# Altium schematic symbol library GyokuRe.SchLib: 1131 symbols (part 3 of 8)
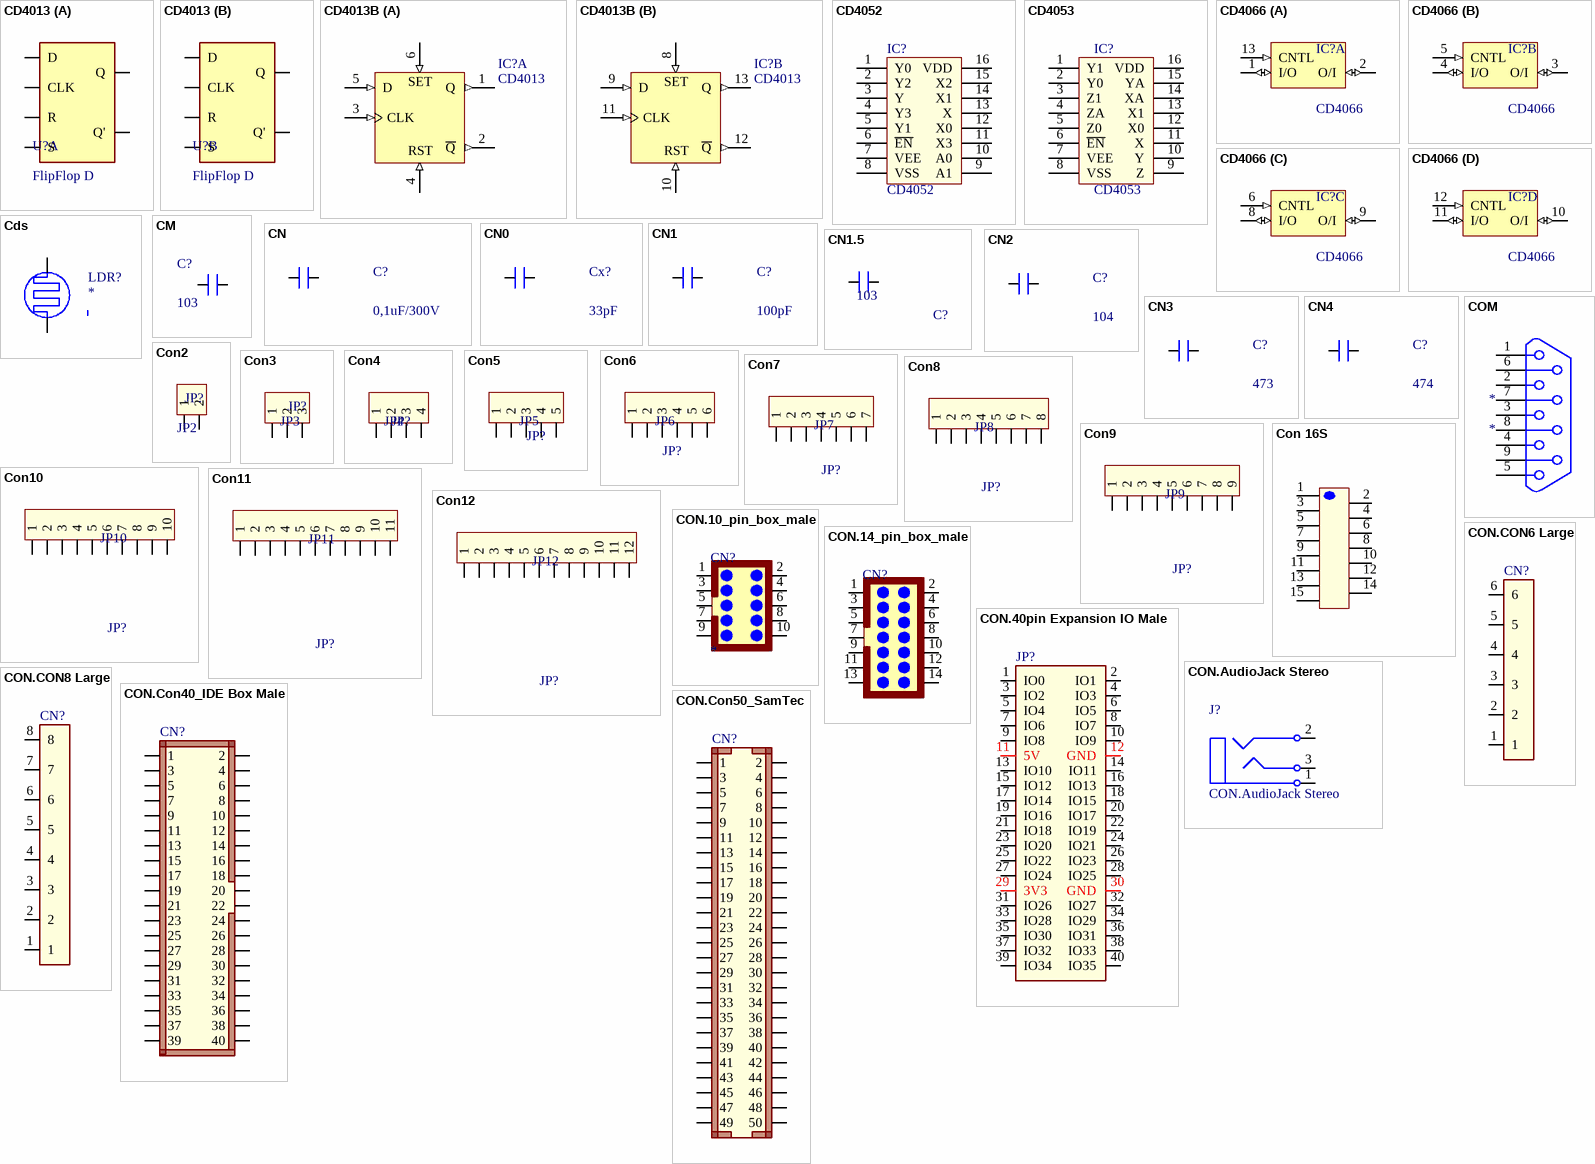
[diagram p51: symbols CD4013 to CON.Con50_SamTec]

## Con12
designator JP?, comment JP12
Connector 12; Value: Connector 12
footprint CON12
pins: 1, 2, 3, 4, 5, 6, 7, 8, 9, 10, 11, 12

## Con 16S
designator J?, comment Con16S
Connector 16S; Value: Con 16S
footprint CON16S (Jam 16S)
pins: 1, 2 3, 3 5, 4 7, 5 9, 6 11, 7 13, 8 15, 9 16, 10 17, 11 18, 12 19, 13 20, 14 21, 15 22

## CON.10_pin_box_male
designator CN?
10 pin box male; Publisher: Hoang Nguyen; ComponentLink1Description: Digikey Part link; ComponentLink2Description: Open DataSheet; ComponentLink2URL: H:\LIBRARY\LIBRARY.Datasheet\
3D model 10_pin_box_male (PCB3D Model)
3D model TSS-105-01-X-D (PCB3D Model)
3D model TSS-105-04-X-D-RA (PCB3D Model)
footprint 10 pin box male
footprint 10 pin box male Vertical (Connector; IDC, Low Profile Male Header, Thru-Hole; 10 Position; Right Angle; Pitch 2.54 mm; Body 20.32 x 8.9 x 9.2 mm (LxWxH))
pins: 1, 2, 3, 4, 5, 6, 7, 8, 9, 10

## CON.14_pin_box_male
designator CN?  (value not drawn)
14 pins box male; Publisher: Hoang Nguyen; ComponentLink1Description: Digikey Part link; ComponentLink2Description: Open DataSheet; ComponentLink2URL: H:\LIBRARY\LIBRARY.Datasheet\
3D model TSS-107-01-X-D (PCB3D Model)
footprint 14 pin box male
footprint 14 pin box male Vertical (Connector; IDC, Low Profile Male Header, Thru-Hole; 14 Position; Right Angle; Pitch 2.54 mm; Body 25.40 x 8.9 x 9.2 mm (LxWxH))
pins: 1, 2, 3, 4, 5, 6, 7, 8, 9, 10, 11, 12, 13, 14

## CON.40pin Expansion IO Male
designator JP?  (value not drawn)
40pin Expansion IO Male; Publisher: Hoang Nguyen; ComponentLink1Description: Digikey Part link; ComponentLink2Description: Open DataSheet; ComponentLink2URL: H:\LIBRARY\LIBRARY.Datasheet\
footprint HDR2X20
footprint HDR2X20H
pins: 1 IO0, 2 IO1, 3 IO2, 4 IO3, 5 IO4, 6 IO5, 7 IO6, 8 IO7, 9 IO8, 10 IO9, 11 5V, 12 GND, 13 IO10, 14 IO11, 15 IO12, 16 IO13, 17 IO14, 18 IO15, 19 IO16, 20 IO17, 21 IO18, 22 IO19, 23 IO20, 24 IO21, 25 IO22, 26 IO23, 27 IO24, 28 IO25, 29 3V3, 30 GND, 31 IO26, 32 IO27, 33 IO28, 34 IO29, 35 IO30, 36 IO31, 37 IO32, 38 IO33, 39 IO34, 40 IO35

## CON.AudioJack Stereo
designator J?
AUDIO JACK 3.5MM STEREO SMD; Vendor: Digi-Key; Vendor P/N: CP-3523SJTR-ND; Published: 5-Jan-2004; DatasheetDocument: 07-Mar-2000; Publisher: Altium Limited; Mounting Type: Surface Mount, Right Angle; ComponentLink1Description: Digikey Part link; ComponentLink1URL: http://search.digikey.com/scripts/DkSearch/dksus.dll?Detail&name=CP-3523SJTR-ND; ComponentLink2Description: Open DataSheet; ComponentLink2URL: H:\LIBRARY\LIBRARY.Datasheet\
pcadlib ST-3150-5N (Stereo Jack, 3.5mm, 5 Position)
footprint SJ-3523-SMT (CONN AUDIO JACK 3.5MM STEREO SMD)
footprint Audio jack 3.5mm
pins: 1, 2, 3

## CON.CON6 Large
designator CN?  (value not drawn)
CON 6 LARGE; Publisher: Hoang Nguyen; ComponentLink1Description: Digikey Part link; ComponentLink2Description: Open DataSheet; ComponentLink2URL: H:\LIBRARY\LIBRARY.Datasheet\
footprint 6CHANNEWS
pins: 1, 2, 3, 4, 5, 6

## CON.CON8 Large
designator CN?  (value not drawn)
8 pins large Connector; Publisher: Hoang Nguyen; ComponentLink1Description: Digikey Part link; ComponentLink2Description: Open DataSheet; ComponentLink2URL: H:\LIBRARY\LIBRARY.Datasheet\
footprint 8CHANNEWS
pins: 1, 2, 3, 4, 5, 6, 7, 8

## CON.Con40_IDE Box Male
designator CN?  (value not drawn)
40pins IDE Box Male; Publisher: Hoang Nguyen; ComponentLink1Description: Digikey Part link; ComponentLink2Description: Open DataSheet; ComponentLink2URL: H:\LIBRARY\LIBRARY.Datasheet\
footprint HDR2X20H
footprint HDR2X20
pins: 1, 2, 3, 4, 5, 6, 7, 8, 9, 10, 11, 12, 13, 14, 15, 16, 17, 18, 19, 20, 21, 22, 23, 24, 25, 26, 27, 28, 29, 30, 31, 32, 33, 34, 35, 36, 37, 38, 39, 40

## CON.Con50_SamTec
designator CN?  (value not drawn)
50 pins SamTec Connector; Publisher: Hoang Nguyen; ComponentLink1Description: Digikey Part link; ComponentLink2Description: Open DataSheet; ComponentLink2URL: H:\LIBRARY\LIBRARY.Datasheet\
footprint Con50_SamTec
pins: 1, 2, 3, 4, 5, 6, 7, 8, 9, 10, 11, 12, 13, 14, 15, 16, 17, 18, 19, 20, 21, 22, 23, 24, 25, 26, 27, 28, 29, 30, 31, 32, 33, 34, 35, 36, 37, 38, 39, 40, 41, 42, 43, 44, 45, 46, 47, 48, 49, 50

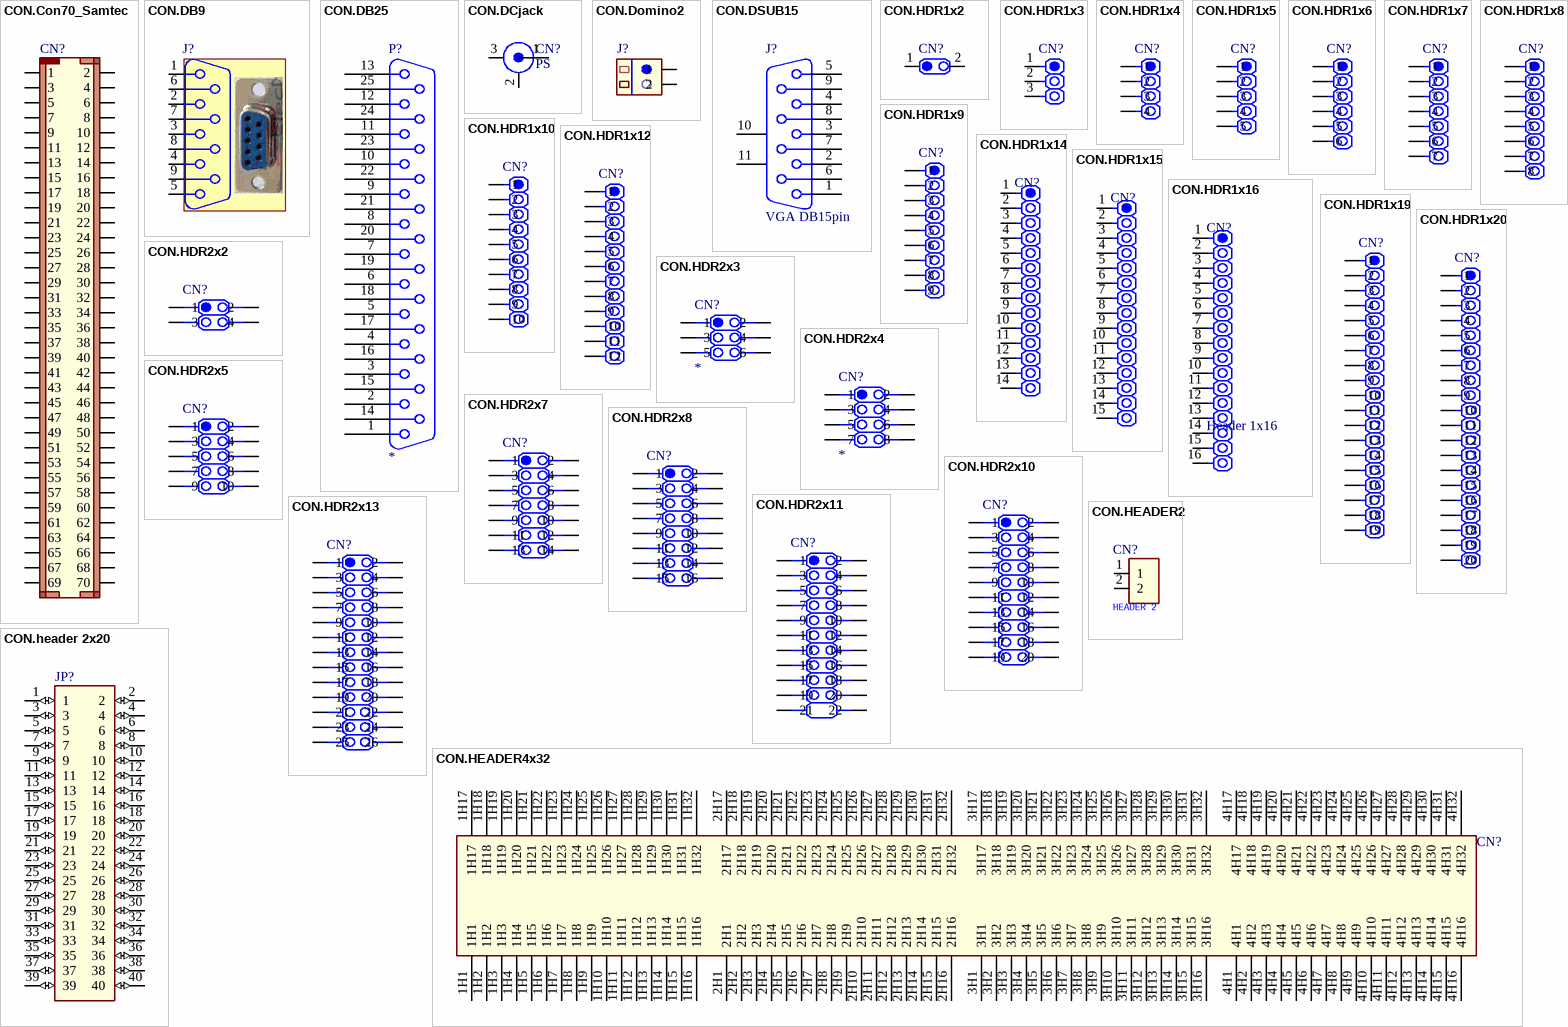
[diagram p13: symbols CON.Con70_Samtec to CON.header 2x20]

## CON.Con70_Samtec
designator CN?  (value not drawn)
70 Pins Samtec Connector; Publisher: Hoang Nguyen; ComponentLink1Description: Digikey Part link; ComponentLink2Description: Open DataSheet; ComponentLink2URL: H:\LIBRARY\LIBRARY.Datasheet\
footprint Con70_Samtec
pins: 1, 2, 3, 4, 5, 6, 7, 8, 9, 10, 11, 12, 13, 14, 15, 16, 17, 18, 19, 20, 21, 22, 23, 24, 25, 26, 27, 28, 29, 30, 31, 32, 33, 34, 35, 36, 37, 38, 39, 40, 41, 42, 43, 44, 45, 46, 47, 48, 49, 50, 51, 52, 53, 54, 55, 56, 57, 58, 59, 60, 61, 62, 63, 64, 65, 66, 67, 68, 69, 70

## CON.DB9
designator J?  (value not drawn)
CONN DB9 FEMALE .318" R/A NICKEL; Manufacturer: Norcomp Inc; Manufacturer P/N: 182-009-213R161; Vendor: DegiKey; Vendor P/N: 182-709FE-ND; Publisher: Hoang Nguyen; ComponentLink1Description: Digikey Part link; ComponentLink2Description: Open DataSheet; ComponentLink2URL: H:\LIBRARY\LIBRARY.Datasheet\; Price: 3.000VND
footprint DSUB1.9_FEMALE (7906 Series DSUB Right Angle Socket; Body Width, 30.81mm, 9 Positions)
footprint DSUB1.9_MALE (7906 Series DSUB Right Angle Plug; Body Width, 30.81mm, 9 Positions)
footprint DSUB1.9_FEMALE_N (7906 Series DSUB Right Angle Socket; Body Width, 30.81mm, 9 Positions)
footprint DSUB1.9_FEMALE_M (7906 Series DSUB Right Angle Socket; Body Width, 30.81mm, 9 Positions)
footprint DSUB1.9_modified (7906 Series DSUB Right Angle Socket; Body Width, 30.81mm, 9 Positions)
pins: 1, 2, 3, 4, 5, 6, 7, 8, 9

## CON.DB25
designator P?
Parallel Port; ComponentLink1Description: Digikey Part link; ComponentLink2Description: Open DataSheet; ComponentLink2URL: H:\LIBRARY\LIBRARY.Datasheet\
pins: 1, 2, 3, 4, 5, 6, 7, 8, 9, 10, 11, 12, 13, 14, 15, 16, 17, 18, 19, 20, 21, 22, 23, 24, 25

## CON.DCjack
designator CN?, comment PS
DC Power Jack, 2.5mm, KLD Series, PCB Mount; Vendor: Nhat Tao; ComponentLink1Description: Digikey Part link; ComponentLink2Description: Open DataSheet; ComponentLink2URL: H:\LIBRARY\LIBRARY.Datasheet\; Price: 1.500VND
footprint DC TERMINAL (DC Terminal; Solder Pad 30mil)
footprint JACK DC
pins: 1 CENTER (power), 2 SHIELD (power), 3 SHIELD

## CON.Domino2
designator J?  (value not drawn)
2 pins Domino Header; Publisher: Hoang Nguyen; ComponentLink1Description: Digikey Part link; ComponentLink2Description: Open DataSheet; ComponentLink2URL: H:\LIBRARY\LIBRARY.Datasheet\; Price: 2000VND
footprint TS2.54x2 (Screw Terminal Strip, 2 Way, 2.54 mm Pitch)
footprint Domino 2
footprint Domino 2 - Thao roi
footprint Domino 2N
footprint Domino 2M
pins: 1, 2

## CON.DSUB15
designator J?, comment VGA DB15pin
Published: 5-Jan-2004; Publisher: Altium Limited; ComponentLink1Description: Digikey Part link; ComponentLink2Description: Open DataSheet; ComponentLink2URL: H:\LIBRARY\LIBRARY.Datasheet\; Price: 3500VND
footprint DSUB1.385-2H9 (7906 Series DSUB Right Angle Socket; Body Width, 30.81mm, 9 Positions)
pcadlib DSUB1.385-2H9 (7906 Series DSUB Right Angle Socket; Body Width, 30.81mm, 9 Positions)
pins: 1, 2, 3, 4, 5, 6, 7, 8, 9, 10 MH1, 11 MH2

## CON.HDR1x2
designator CN?, comment IO  (value not drawn)
Header 1x2; Publisher: Hoang Nguyen; ComponentLink1Description: Digikey Part link; ComponentLink2Description: Open DataSheet; ComponentLink2URL: H:\LIBRARY\LIBRARY.Datasheet\
footprint CON.HDR1X2
3D model HDR2x1 (PCB3D Model)
footprint CON.HDR1X2H
3D model TSW-102-06-X-S (PCB3D Model)
3D model TSW-102-07-X-S (PCB3D Model)
pins: 1, 2

## CON.HDR1x3
designator CN?, comment IO  (value not drawn)
Header 1x3; Publisher: Hoang Nguyen; ComponentLink1Description: Digikey Part link; ComponentLink2Description: Open DataSheet; ComponentLink2URL: H:\LIBRARY\LIBRARY.Datasheet\
footprint CON.HDR1X3
footprint CON.HDR1X3H
footprint CON1X3N (Footprint not found)
pins: 1, 2, 3

## CON.HDR1x4
designator CN?, comment IO  (value not drawn)
Header 1x4; Publisher: Hoang Nguyen; ComponentLink1Description: Digikey Part link; ComponentLink2Description: Open DataSheet; ComponentLink2URL: H:\LIBRARY\LIBRARY.Datasheet\
footprint CON.HDR1X4
footprint CON.HDR1X4H
footprint CON1X4N
pins: 1, 2, 3, 4

## CON.HDR1x5
designator CN?, comment IO  (value not drawn)
Header 1x5; Publisher: Hoang Nguyen; ComponentLink1Description: Digikey Part link; ComponentLink2Description: Open DataSheet; ComponentLink2URL: H:\LIBRARY\LIBRARY.Datasheet\
footprint CON.HDR1X5
footprint CON.HDR1X5H
footprint CON1X5N
pins: 1, 2, 3, 4, 5

## CON.HDR1x6
designator CN?, comment IO  (value not drawn)
Header 1x6; Publisher: Hoang Nguyen; ComponentLink1Description: Digikey Part link; ComponentLink2Description: Open DataSheet; ComponentLink2URL: H:\LIBRARY\LIBRARY.Datasheet\
footprint CON.HDR1X6
footprint CON.HDR1X6H
footprint CON1X6N
pins: 1, 2, 3, 4, 5, 6

## CON.HDR1x7
designator CN?  (value not drawn)
Header 1x7; Publisher: Hoang Nguyen; ComponentLink1Description: Digikey Part link; ComponentLink2Description: Open DataSheet; ComponentLink2URL: H:\LIBRARY\LIBRARY.Datasheet\
footprint CON.HDR1X7
footprint CON.HDR1X7H
pins: 1, 2, 3, 4, 5, 6, 7

## CON.HDR1x8
designator CN?  (value not drawn)
Header 1x8; Publisher: Hoang Nguyen; ComponentLink1Description: Digikey Part link; ComponentLink2Description: Open DataSheet; ComponentLink2URL: H:\LIBRARY\LIBRARY.Datasheet\
footprint HDR1X8
footprint HDR1X8H
footprint CON1X8N
pins: 1, 2, 3, 4, 5, 6, 7, 8

## CON.HDR1x9
designator CN?  (value not drawn)
Header 1x9; Publisher: Hoang Nguyen; ComponentLink1Description: Digikey Part link; ComponentLink2Description: Open DataSheet; ComponentLink2URL: H:\LIBRARY\LIBRARY.Datasheet\
footprint HDR1X9
footprint HDR1X9H
pins: 1, 2, 3, 4, 5, 6, 7, 8, 9

## CON.HDR1x10
designator CN?  (value not drawn)
Header 1x10; Publisher: Hoang Nguyen; ComponentLink1Description: Digikey Part link; ComponentLink2Description: Open DataSheet; ComponentLink2URL: H:\LIBRARY\LIBRARY.Datasheet\
footprint HDR1X10
footprint HDR1X10H
footprint CON1X10N
pins: 1, 2, 3, 4, 5, 6, 7, 8, 9, 10

## CON.HDR1x12
designator CN?  (value not drawn)
Header 1x12; Publisher: Hoang Nguyen; ComponentLink1Description: Digikey Part link; ComponentLink2Description: Open DataSheet; ComponentLink2URL: H:\LIBRARY\LIBRARY.Datasheet\
footprint HDR1X12
footprint HDR1X12H
pins: 1, 2, 3, 4, 5, 6, 7, 8, 9, 10, 11, 12

## CON.HDR1x14
designator CN?  (value not drawn)
Header 1x14; Publisher: Hoang Nguyen; ComponentLink1Description: Digikey Part link; ComponentLink2Description: Open DataSheet; ComponentLink2URL: H:\LIBRARY\LIBRARY.Datasheet\
footprint HDR1X14
footprint HDR1X14H
footprint CON1X14N
pins: 1, 2, 3, 4, 5, 6, 7, 8, 9, 10, 11, 12, 13, 14

## CON.HDR1x15
designator CN?  (value not drawn)
Header 1x15; Publisher: Hoang Nguyen; ComponentLink1Description: Digikey Part link; ComponentLink2Description: Open DataSheet; ComponentLink2URL: H:\LIBRARY\LIBRARY.Datasheet\
footprint HDR1X15
footprint HDR1X15H
pins: 1, 2, 3, 4, 5, 6, 7, 8, 9, 10, 11, 12, 13, 14, 15

## CON.HDR1x16
designator CN?, comment Header 1x16
Publisher: Hoang Nguyen; Value: Header1x16; ComponentLink1Description: Digikey Part link; ComponentLink2Description: Open DataSheet; ComponentLink2URL: H:\LIBRARY\LIBRARY.Datasheet\
footprint HDR1X16
footprint HDR1X16H
pins: 1, 2, 3, 4, 5, 6, 7, 8, 9, 10, 11, 12, 13, 14, 15, 16

## CON.HDR1x19
designator CN?  (value not drawn)
Header 1x19; Publisher: Hoang Nguyen; ComponentLink1Description: Digikey Part link; ComponentLink2Description: Open DataSheet; ComponentLink2URL: H:\LIBRARY\LIBRARY.Datasheet\
footprint HDR1X19
footprint HDR1X19H
pins: 1, 2, 3, 4, 5, 6, 7, 8, 9, 10, 11, 12, 13, 14, 15, 16, 17, 18, 19

## CON.HDR1x20
designator CN?  (value not drawn)
Header 1x20; Publisher: Hoang Nguyen; ComponentLink1Description: Digikey Part link; ComponentLink2Description: Open DataSheet; ComponentLink2URL: H:\LIBRARY\LIBRARY.Datasheet\
footprint HDR1X20
footprint HDR1X20H
pins: 1, 2, 3, 4, 5, 6, 7, 8, 9, 10, 11, 12, 13, 14, 15, 16, 17, 18, 19, 20

## CON.HDR2x2
designator CN?  (value not drawn)
Header 2x2; Publisher: Hoang Nguyen; ComponentLink1Description: Digikey Part link; ComponentLink2Description: Open DataSheet; ComponentLink2URL: H:\LIBRARY\LIBRARY.Datasheet\
footprint HDR2X2
footprint HDR2X2H
pins: 1, 2, 3, 4

## CON.HDR2x3
designator CN?
Header 2x3; Publisher: Hoang Nguyen; ComponentLink1Description: Digikey Part link; ComponentLink2Description: Open DataSheet; ComponentLink2URL: H:\LIBRARY\LIBRARY.Datasheet\
footprint HDR2X3
footprint HDR2X3H
3D model TSW-103-08-X-D (PCB3D Model)
pins: 1, 2, 3, 4, 5, 6

## CON.HDR2x4
designator CN?
Header 2x4; Publisher: Hoang Nguyen; ComponentLink1Description: Digikey Part link; ComponentLink2Description: Open DataSheet; ComponentLink2URL: H:\LIBRARY\LIBRARY.Datasheet\
footprint HDR2X4
footprint HDR2X4H
3D model TSW-104-07-X-D (PCB3D Model)
3D model TSW-104-08-X-D-LC (PCB3D Model)
pins: 1, 2, 3, 4, 5, 6, 7, 8

## CON.HDR2x5
designator CN?  (value not drawn)
Header 2x5; Publisher: Hoang Nguyen; ComponentLink1Description: Digikey Part link; ComponentLink2Description: Open DataSheet; ComponentLink2URL: H:\LIBRARY\LIBRARY.Datasheet\
footprint HDR2X5
footprint HDR2X5H
footprint CON2x5N
pins: 1, 2, 3, 4, 5, 6, 7, 8, 9, 10

## CON.HDR2x7
designator CN?  (value not drawn)
Header 2x7; Publisher: Hoang Nguyen; ComponentLink1Description: Digikey Part link; ComponentLink2Description: Open DataSheet; ComponentLink2URL: H:\LIBRARY\LIBRARY.Datasheet\
footprint HDR2X7
footprint HDR2X8H
footprint CON2X7N
pins: 1, 2, 3, 4, 5, 6, 7, 8, 9, 10, 11, 12, 13, 14

## CON.HDR2x8
designator CN?  (value not drawn)
Header 2x8; Publisher: Hoang Nguyen; ComponentLink1Description: Digikey Part link; ComponentLink2Description: Open DataSheet; ComponentLink2URL: H:\LIBRARY\LIBRARY.Datasheet\
footprint HDR2X8
footprint HDR2X8H
footprint CON2X8N
pins: 1, 2, 3, 4, 5, 6, 7, 8, 9, 10, 11, 12, 13, 14, 15, 16

## CON.HDR2x10
designator CN?  (value not drawn)
Header 2x10; Publisher: Hoang Nguyen; ComponentLink1Description: Digikey Part link; ComponentLink2Description: Open DataSheet; ComponentLink2URL: H:\LIBRARY\LIBRARY.Datasheet\
footprint HDR2X10
footprint HDR2X10H
3D model TSW-110-07-X-D (PCB3D Model)
3D model TSW-110-14-X-D (PCB3D Model)
pins: 1, 2, 3, 4, 5, 6, 7, 8, 9, 10, 11, 12, 13, 14, 15, 16, 17, 18, 19, 20

## CON.HDR2x11
designator CN?  (value not drawn)
Header 2x11; Publisher: Hoang Nguyen; ComponentLink1Description: Digikey Part link; ComponentLink2Description: Open DataSheet; ComponentLink2URL: H:\LIBRARY\LIBRARY.Datasheet\
footprint HDR2X11
footprint HDR2X11H
pins: 1, 2, 3, 4, 5, 6, 7, 8, 9, 10, 11, 12, 13, 14, 15, 16, 17, 18, 19, 20, 21, 22

## CON.HDR2x13
designator CN?  (value not drawn)
Header 2x13; Publisher: Hoang Nguyen; ComponentLink1Description: Digikey Part link; ComponentLink2Description: Open DataSheet; ComponentLink2URL: H:\LIBRARY\LIBRARY.Datasheet\
footprint HDR2X13
footprint HDR2X13H
pins: 1, 2, 3, 4, 5, 6, 7, 8, 9, 10, 11, 12, 13, 14, 15, 16, 17, 18, 19, 20, 21, 22, 23, 24, 25, 26

## CON.HEADER2
designator CN?  (value not drawn)
Header 1x2; ComponentLink1Description: Digikey Part link; ComponentLink2Description: Open DataSheet; ComponentLink2URL: H:\LIBRARY\LIBRARY.Datasheet\
pins: 1, 2
text: HEADER 2

## CON.HEADER4x32
designator CN?  (value not drawn)
Header 4x32; ComponentLink1Description: Digikey Part link; ComponentLink2Description: Open DataSheet; ComponentLink2URL: H:\LIBRARY\LIBRARY.Datasheet\
pins: 1H1, 1H2, 1H3, 1H4, 1H5, 1H6, 1H7, 1H8, 1H9, 1H10, 1H11, 1H12, 1H13, 1H14, 1H15, 1H16, 1H17, 1H18, 1H19, 1H20, 1H21, 1H22, 1H23, 1H24, 1H25, 1H26, 1H27, 1H28, 1H29, 1H30, 1H31, 1H32, 2H1, 2H2, 2H3, 2H4, 2H5, 2H6, 2H7, 2H8, 2H9, 2H10, 2H11, 2H12, 2H13, 2H14, 2H15, 2H16, 2H17, 2H18, 2H19, 2H20, 2H21, 2H22, 2H23, 2H24, 2H25, 2H26, 2H27, 2H28, 2H29, 2H30, 2H31, 2H32, 3H1, 3H2, 3H3, 3H4, 3H5, 3H6, 3H7, 3H8, 3H9, 3H10, 3H11, 3H12, 3H13, 3H14, 3H15, 3H16, 3H17, 3H18, 3H19, 3H20, 3H21, 3H22, 3H23, 3H24, 3H25, 3H26, 3H27, 3H28, 3H29, 3H30, 3H31, 3H32, 4H1, 4H2, 4H3, 4H4, 4H5, 4H6, 4H7, 4H8, 4H9, 4H10, 4H11, 4H12, 4H13, 4H14, 4H15, 4H16, 4H17, 4H18, 4H19, 4H20, 4H21, 4H22, 4H23, 4H24, 4H25, 4H26, 4H27, 4H28, 4H29, 4H30, 4H31, 4H32

## CON.header 2x20
designator JP?  (value not drawn)
2x20 header; Publisher: Hoang Nguyen; ComponentLink1Description: Digikey Part link; ComponentLink2Description: Open DataSheet; ComponentLink2URL: H:\LIBRARY\LIBRARY.Datasheet\
footprint HDR2X20
footprint HDR2X20H
pins: 1 (io), 2 (io), 3 (io), 4 (io), 5 (io), 6 (io), 7 (io), 8 (io), 9 (io), 10 (io), 11 (io), 12 (io), 13 (io), 14 (io), 15 (io), 16 (io), 17 (io), 18 (io), 19 (io), 20 (io), 21 (io), 22 (io), 23 (io), 24 (io), 25 (io), 26 (io), 27 (io), 28 (io), 29 (io), 30 (io), 31 (io), 32 (io), 33 (io), 34 (io), 35 (io), 36 (io), 37 (io), 38 (io), 39 (io), 40 (io)
